# Altium footprint library PcbLib.PcbLib: 108 footprints (part 5 of 7)
Each footprint in its own frame and in the unit in brackets; x right, y up, seen from the top. Pads: shape width x height; smd on the part's side, far side on the other; paste and mask are expansions set on the pad; w line width, h text height; cw(c..) or ccw(c..) is an arc to the next point about the centre after c.
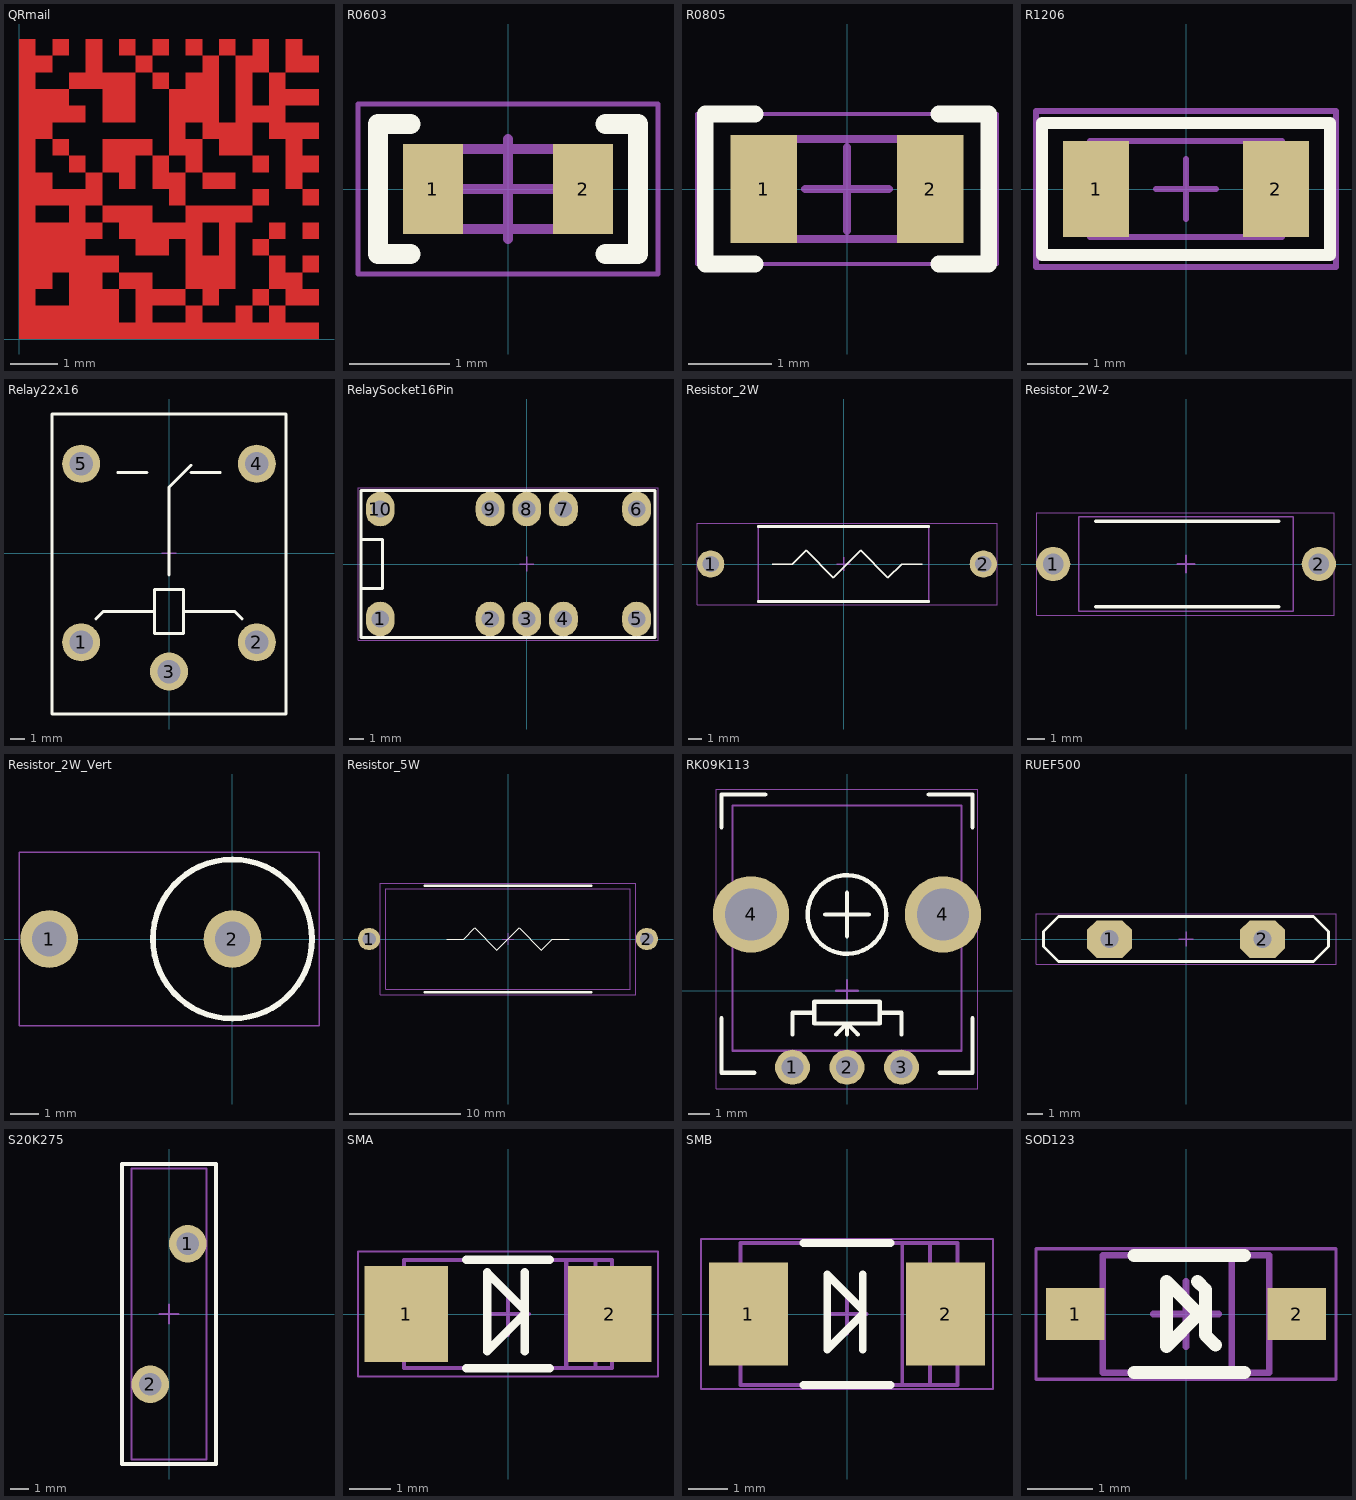
[diagram p4: the footprints below, top view; thin cyan lines are the x and y axes]

## QRmail [mm]
Top Layer:
  rectangle: 1.4,0.35 1.75,0.7
  rectangle: 1.4,0.7 1.75,1.05
  rectangle: 1.05,0.7 1.4,1.05
  rectangle: 1.05,0.35 1.4,0.7
  rectangle: 0.7,0.35 1.05,0.7
  rectangle: 0.35,0.35 0.7,0.7
  rectangle: 0.35,1.4 0.7,1.75
  rectangle: 1.05,1.05 1.4,1.4
  rectangle: 1.4,1.05 1.75,1.4
  rectangle: 1.75,0.35 2.1,0.7
  rectangle: 1.75,0.7 2.1,1.05
  rectangle: 2.1,1.05 2.45,1.4
  rectangle: 2.45,1.05 2.8,1.4
  rectangle: 2.45,0.7 2.8,1.05
  rectangle: 2.8,0.7 3.15,1.05
  rectangle: 3.15,0.7 3.5,1.05
  rectangle: 2.45,0.35 2.8,0.7
  rectangle: 3.5,0.35 3.85,0.7
  rectangle: 4.55,0.35 4.9,0.7
  rectangle: 5.25,0.35 5.6,0.7
  rectangle: 4.9,0.7 5.25,1.05
  rectangle: 5.6,0.7 5.95,1.05
  rectangle: 3.85,0.7 4.2,1.05
  rectangle: 3.5,1.05 3.85,1.4
  rectangle: 3.85,1.05 4.2,1.4
  rectangle: 4.2,1.05 4.55,1.4
  rectangle: 5.25,1.05 5.6,1.4
  rectangle: 5.6,1.05 5.95,1.4
  rectangle: 0.35,1.05 0.7,1.4
  rectangle: 0.7,1.4 1.05,1.75
  rectangle: 1.05,1.4 1.4,1.75
  rectangle: 1.4,1.4 1.75,1.75
  rectangle: 1.75,1.4 2.1,1.75
  rectangle: 3.5,1.4 3.85,1.75
  rectangle: 3.85,1.4 4.2,1.75
  rectangle: 4.2,1.4 4.55,1.75
  rectangle: 5.25,1.4 5.6,1.75
  rectangle: 4.9,1.75 5.25,2.1
  rectangle: 4.2,1.75 4.55,2.1
  rectangle: 3.5,1.75 3.85,2.1
  rectangle: 2.8,1.75 3.15,2.1
  rectangle: 2.45,1.75 2.8,2.1
  rectangle: 0.35,1.75 0.7,2.1
  rectangle: 0.7,1.75 1.05,2.1
  rectangle: 1.05,1.75 1.4,2.1
  rectangle: 1.4,2.1 1.75,2.45
  rectangle: 1.05,2.1 1.4,2.45
  rectangle: 0.35,2.1 0.7,2.45
  rectangle: 0.7,2.1 1.05,2.45
  rectangle: 2.1,2.1 2.45,2.45
  rectangle: 2.45,2.1 2.8,2.45
  rectangle: 2.8,2.1 3.15,2.45
  rectangle: 3.15,2.1 3.5,2.45
  rectangle: 3.5,2.1 3.85,2.45
  rectangle: 4.2,2.1 4.55,2.45
  rectangle: 5.25,2.1 5.6,2.45
  rectangle: 4.55,2.45 4.9,2.8
  rectangle: 4.2,2.45 4.55,2.8
  rectangle: 3.85,2.45 4.2,2.8
  rectangle: 3.5,2.45 3.85,2.8
  rectangle: 2.45,2.45 2.8,2.8
  rectangle: 2.1,2.45 2.45,2.8
  rectangle: 1.75,2.45 2.1,2.8
  rectangle: 1.05,2.45 1.4,2.8
  rectangle: 0.35,3.15 0.7,3.5
  rectangle: 0.35,2.8 0.7,3.15
  rectangle: 0.7,2.8 1.05,3.15
  rectangle: 1.05,2.8 1.4,3.15
  rectangle: 1.4,2.8 1.75,3.15
  rectangle: 1.4,3.15 1.75,3.5
  rectangle: 5.6,3.15 5.95,3.5
  rectangle: 5.6,3.5 5.95,3.85
  rectangle: 5.6,3.85 5.95,4.2
  rectangle: 4.9,2.8 5.25,3.15
  rectangle: 4.9,3.5 5.25,3.85
  rectangle: 4.55,3.85 4.9,4.2
  rectangle: 4.2,3.85 4.55,4.2
  rectangle: 4.2,3.15 4.55,3.5
  rectangle: 3.85,3.15 4.2,3.5
  rectangle: 3.5,3.5 3.85,3.85
  rectangle: 3.5,3.85 3.85,4.2
  rectangle: 3.15,3.85 3.5,4.2
  rectangle: 3.15,2.8 3.5,3.15
  rectangle: 3.15,3.15 3.5,3.5
  rectangle: 2.8,3.15 3.15,3.5
  rectangle: 2.8,3.5 3.15,3.85
  rectangle: 2.45,3.85 2.8,4.2
  rectangle: 2.1,3.15 2.45,3.5
  rectangle: 2.1,3.5 2.45,3.85
  rectangle: 2.1,3.85 2.45,4.2
  rectangle: 1.75,3.5 2.1,3.85
  rectangle: 1.75,3.85 2.1,4.2
  rectangle: 1.05,3.5 1.4,3.85
  rectangle: 0.7,3.85 1.05,4.2
  rectangle: 0.35,4.2 0.7,4.55
  rectangle: 3.15,4.55 3.5,4.9
  rectangle: 3.85,4.2 4.2,4.55
  rectangle: 4.2,4.2 4.55,4.55
  rectangle: 4.55,4.2 4.9,4.55
  rectangle: 5.25,4.2 5.6,4.55
  rectangle: 5.6,4.2 5.95,4.55
  rectangle: 5.25,4.55 5.6,4.9
  rectangle: 4.9,4.55 5.25,4.9
  rectangle: 4.55,4.55 4.9,4.9
  rectangle: 3.85,4.55 4.2,4.9
  rectangle: 3.5,4.55 3.85,4.9
  rectangle: 3.15,4.2 3.5,4.55
  rectangle: 2.1,4.55 2.45,4.9
  rectangle: 1.75,4.55 2.1,4.9
  rectangle: 0.35,4.55 0.7,4.9
  rectangle: 0.7,4.55 1.05,4.9
  rectangle: 1.05,4.55 1.4,4.9
  rectangle: 0.35,4.9 0.7,5.25
  rectangle: 0.7,4.9 1.05,5.25
  rectangle: 1.75,4.9 2.1,5.25
  rectangle: 2.1,4.9 2.45,5.25
  rectangle: 3.15,4.9 3.5,5.25
  rectangle: 3.5,4.9 3.85,5.25
  rectangle: 3.85,4.9 4.2,5.25
  rectangle: 4.55,4.9 4.9,5.25
  rectangle: 5.25,4.9 5.6,5.25
  rectangle: 5.6,4.9 5.95,5.25
  rectangle: 5.25,5.25 5.6,5.6
  rectangle: 4.55,5.25 4.9,5.6
  rectangle: 3.85,5.25 4.2,5.6
  rectangle: 3.5,5.25 3.85,5.6
  rectangle: 2.8,5.25 3.15,5.6
  rectangle: 2.1,5.25 2.45,5.6
  rectangle: 1.75,5.25 2.1,5.6
  rectangle: 1.4,5.25 1.75,5.6
  rectangle: 1.05,5.25 1.4,5.6
  rectangle: 5.6,5.6 5.95,5.95
  rectangle: 4.9,5.6 5.25,5.95
  rectangle: 4.55,5.6 4.9,5.95
  rectangle: 3.85,5.6 4.2,5.95
  rectangle: 2.45,5.6 2.8,5.95
  rectangle: 1.4,5.6 1.75,5.95
  rectangle: 0.35,5.6 0.7,5.95
  rectangle: 5.95,0.7 6.3,1.05
  rectangle: 5.95,1.4 6.3,1.75
  rectangle: 5.95,2.1 6.3,2.45
  rectangle: 5.95,2.8 6.3,3.15
  rectangle: 5.95,3.5 6.3,3.85
  rectangle: 5.95,4.2 6.3,4.55
  rectangle: 5.95,4.9 6.3,5.25
  rectangle: 5.95,5.6 6.3,5.95
  rectangle: 5.6,5.95 5.95,6.3
  rectangle: 4.9,5.95 5.25,6.3
  rectangle: 4.2,5.95 4.55,6.3
  rectangle: 3.5,5.95 3.85,6.3
  rectangle: 2.8,5.95 3.15,6.3
  rectangle: 2.1,5.95 2.45,6.3
  rectangle: 1.4,5.95 1.75,6.3
  rectangle: 0.7,5.95 1.05,6.3
  rectangle: 0,0.35 0.35,6.3
  rectangle: 0,0 6.3,0.35

## R0603 [mm]
height 0.45
pads (2):
  rect 0.6x0.9 smd: 1(-0.75,0) 2(0.75,0)
Top Overlay:
  lines w0.2: -0.975,-0.65 -1.3,-0.65 -1.3,0.65 -0.975,0.65 ; 0.975,-0.65 1.3,-0.65 1.3,0.65 0.975,0.65
Mechanical 13:
  lines w0.05: -1.5,-0.85 -1.5,0.85 1.5,0.85 1.5,-0.85 -1.5,-0.85
  lines w0.1: -0.5,0 0.5,0 ; 0,-0.5 0,0.5
Mechanical 14:
  lines w0.1: -0.8,-0.4 -0.8,0.4 0.7,0.4 0.7,-0.4 -0.8,-0.4
3D body "User Library-CR1608-0603.step": height 0.45, standoff 0, extent -0.8,-0.4 0.8,0.4

## R0805 [mm]
height 0.6
pads (2):
  rect 0.8x1.3 smd: 1(-1,0) 2(1,0)
Top Overlay:
  lines w0.2: -1.1,-0.9 -1.7,-0.9 -1.7,0.9 -1.1,0.9 ; 1.1,-0.9 1.7,-0.9 1.7,0.9 1.1,0.9
Mechanical 13:
  lines w0.05: -1.8,-0.9 -1.8,0.9 1.8,0.9 1.8,-0.9 -1.8,-0.9
  lines w0.1: -0.5,0 0.5,0 ; 0,-0.5 0,0.5
Mechanical 14:
  lines w0.1: -1,-0.6 -1,0.6 1,0.6 1,-0.6 -1,-0.6
3D body "User Library-CR2012-0805.step": height 0.6, standoff 0, extent -1,-0.625 1,0.625

## R1206 [mm]
height 0.6
pads (2):
  rect 1.1x1.6 smd: 1(-1.5,0) 2(1.5,0)
Top Overlay:
  lines w0.2: -2.4,-1.1 -2.4,1.1 2.4,1.1 2.4,-1.1 -2.4,-1.1
Mechanical 13:
  lines w0.1: -0.5,0 0.5,0 ; 0,-0.5 0,0.5 ; -2.5,-1.3 2.5,-1.3 2.5,1.3 -2.5,1.3 -2.5,-1.3
Mechanical 14:
  lines w0.1: -1.6,-0.8 -1.6,0.8 1.6,0.8 1.6,-0.8 -1.6,-0.8
3D body "User Library-CR3216-1206.step": height 0.6, standoff 0, extent -1.6,-0.8 1.6,0.8

## Relay22x16 [mm]
height 15
pads (5):
  round 2.6 hole 1.6: 1(-6,-6.1) 2(6,-6.1) 3(0,-8.1) 4(6,6.1) 5(-6,6.1)
Top Overlay:
  lines w0.2: -5,-4.5 -4.5,-4 -1,-4 ; -3.5,5.5 -1.5,5.5 ; 0,-1.5 0,4.5 1.5,6 ; 1.5,5.5 3.5,5.5 ; 5,-4.5 4.5,-4 1,-4 ; 1,-4 1,-5.5 -1,-5.5 -1,-2.5 1,-2.5 1,-4 ; -8,-11 -8,9.5 0,9.5 8,9.5 8,-11 -8,-11
Mechanical 13:
  lines w0.05: -8,-11 -8,9.5 8,9.5 8,-11 -8,-11
  lines w0.1: -0.5,0 0.5,0 ; 0,-0.5 0,0.5
Mechanical 14:
  lines w0.1: -8,-11 -8,9.5 8,9.5 8,-11 -8,-11
3D body "RELAY  12MMx12MM SQUARE-1.step": height 15.1, standoff -1.9, extent -8,-11 8,9

## RelaySocket16Pin [mm]
pads (10):
  oval 2x2.4 hole 1.2 unplated: 1(-10.16,-3.81) 2(-2.54,-3.81) 3(0,-3.81) 4(2.54,-3.81) 5(7.62,-3.81) 6(7.62,3.81) 7(2.54,3.81) 8(0,3.81) 9(-2.54,3.81) 10(-10.16,3.81)
Top Overlay:
  lines w0.2: -11.5,1.7 -10,1.7 -10,-1.7 -11.4,-1.7 ; -11.5,-5.1 8.9,-5.1 8.9,5.1 -11.5,5.1 -11.5,-5.1
Mechanical 13:
  lines w0.05: -11.7,-5.3 -11.7,5.3 9.1,5.3 9.1,-5.3 -11.7,-5.3
  lines w0.1: -0.5,0 0.5,0 ; 0,-0.5 0,0.5
Mechanical 14:
  lines w0.1: -11.5,-1.7 -10,-1.7 -10,1.7 -11.5,1.7 ; -11.5,-5.1 -11.5,5.1 8.9,5.1 8.9,-5.1 -11.5,-5.1
3D body "16DIP_Socket.step": height 4.19, standoff -3.18, extent -11.46,-5.06 8.86,5.1

## Resistor_2W [mm] "5x12mm"
height 10
pads (2):
  round 2 hole 1.2: 1(-9.75,0) 2(10.25,0)
Top Overlay:
  lines w0.1: -5.25,0 -3.75,0 -2.75,1 -0.75,-1 ; 5.75,0 4.25,0 3.25,-1 1.25,1 -0.75,-1 ; -0.75,-1 -0.75,-1
  lines w0.2: -6.25,-2.75 6.25,-2.75 ; -6.25,2.75 6.25,2.75
Mechanical 13:
  lines w0.05: -10.75,-3 11.25,-3 11.25,3 -10.75,3 -10.75,-3
  lines w0.1: -0.5,0 0.5,0 ; 0,-0.5 0,0.5
Mechanical 14:
  lines w0.1: -6.25,-2.75 -6.25,2.75 6.25,2.75 6.25,-2.75 -6.25,-2.75
3D body "RES-2W.STEP": height 7, standoff -1.5, extent -10.26,-2.75 10.76,2.75

## Resistor_2W-2 [mm] "15mm"
height 10
pads (2):
  round 2 hole 1.2: 1(-7.75,0) 2(7.75,0)
Top Overlay:
  lines w0.2: -5.275,-2.5 5.425,-2.5 ; -5.275,2.5 5.4,2.5
Mechanical 13:
  lines w0.05: -8.7,-3 8.65,-3 8.65,3 -8.7,3 -8.7,-3
  lines w0.1: -0.5,0 0.5,0 ; 0,-0.5 0,0.5
Mechanical 14:
  lines w0.1: -6.25,-2.75 -6.25,2.75 6.25,2.75 6.25,-2.75 -6.25,-2.75
3D body "User Library-RES-1W.STEP": height 6.5, standoff -1.5, extent -7.87,-2.525 8.07,2.475

## Resistor_2W_Vert [mm] "5x12mm"
height 10
pads (2):
  round 2 hole 1.2: 1(-6.35,0) 2(0,0)
Top Overlay:
  circle w0.2: c0,0 r2.759
Mechanical 13:
  lines w0.05: -7.4,-3 3,-3 3,3 -7.4,3 -7.4,-3
  lines w0.1: -0.5,0 0.5,0 ; 0,-0.5 0,0.5
Mechanical 14:
  circle w0.1: c0,0 r2.78
3D body "RES 2W -V  L=15 D=5 d=0,8 Pin2Pin=6,35.STEP": height 20.35, standoff -2, extent -6.747,-2.501 2.5,2.501

## Resistor_5W [mm] "22x10x10"
height 10
pads (2):
  round 2 hole 1.2: 1(-12.5,0) 2(12.5,0)
Top Overlay:
  lines w0.1: -5.5,0 -4,0 -3,1 -1,-1 ; 5.5,0 4,0 3,-1 1,1 -1,-1 ; -1,-1 -1,-1
  lines w0.2: -7.5,-4.8 7.5,-4.8 ; -7.5,4.8 7.5,4.8
Mechanical 13:
  lines w0.05: -11.5,-5 -11.5,5 11.5,5 11.5,-4.5 11.5,-5 -11.5,-5
  lines w0.1: -0.5,0 0.5,0 ; 0,-0.5 0,0.5
Mechanical 14:
  lines w0.1: -11,-4.5 11,-4.5 11,4.5 -11,4.5 -11,0 -11,-4.5
3D body "5W1.STEP": height 10.01, standoff -1.11, extent -13,-4.75 12.807,4.75

## RK09K113 [mm] "RK09K113 20x7mm"
height 20
pads (5):
  round 1.6 hole 1: 1(-2.5,-3.5) 2(0,-3.5) 3(2.5,-3.5)
  round 3.5 hole 2.4: 4(-4.4,3.5) 4(4.4,3.5)
Top Overlay:
  circle w0.2: c0,3.5 r1.803
  lines w0.2: -5.75,-1.25 -5.75,-3.75 -4.25,-3.75 ; -5.75,7.5 -5.75,9 -3.75,9 ; -2.5,-2 -2.5,-1 -1.5,-1 ; -1,3.5 1,3.5 ; -0.5,-2 0,-1.5 ; 0,-2 0,-1.5 ; 0,2.5 0,4.5 ; 0.5,-2 0,-1.5 ; 1.5,-1 2.5,-1 ; 2.5,-2 2.5,-1 ; 3.75,9 5.75,9 5.75,7.5 ; 4.25,-3.75 5.75,-3.75 5.75,-1.25 ; -1.5,-1 -1.5,-0.5 1.5,-0.5 1.5,-1.5 -1.5,-1.5 -1.5,-1 ; 0,-1.5 0,-1.5 ; 0,-1.5 0,-1.5 ; 2.5,-1 2.5,-1
Mechanical 13:
  lines w0.05: -6,-4.5 6,-4.5 6,9.25 -6,9.25 -6,-4.5
  lines w0.1: -0.5,0 0.5,0 ; 0,-0.5 0,0.5
Mechanical 14:
  lines w0.1: -5.25,-2.75 5.25,-2.75 5.25,8.5 -5.25,8.5 -5.25,-2.75
3D body "RK09K1130-20-1.step": height 20, standoff -3.7, extent -5.698,-3.65 5.698,9

## RUEF500 [mm]
height 30
pads (2):
  oct 3x2.5 hole 1.2: 1(-5.1,0) 2(5.1,0)
Top Overlay:
  lines w0.2: -9.5,-0.5 -9.5,0.5 -8.5,1.5 0,1.5 8.5,1.5 9.5,0.5 9.5,-0.5 8.5,-1.5 -8.5,-1.5 -9.5,-0.5
Mechanical 13:
  lines w0.05: -10,-1.7 -10,1.7 10,1.7 10,-1.7 -10,-1.7
  lines w0.1: -0.5,0 0.5,0 ; 0,-0.5 0,0.5
Mechanical 14:
  lines w0.1: -9.5,0.4 -9.5,0.5 -8.5,1.5 8.5,1.5 ; -9.5,0.45 -9.5,-0.5 ; -9.5,-0.5 -8.5,-1.5 8.5,-1.5 9.5,-0.5 ; -9.5,-0.5 -9.5,-0.5 ; 8.5,1.5 8.5,1.5 ; 8.5,1.5 9.5,0.5 9.5,-0.5 ; 9.5,-0.5 9.5,-0.5
3D body "User Library-MF-R700-1.step": height 29.8, standoff -4, extent -10.801,-3.254 10.801,3.3

## S20K275 [mm] "Varistor EPCOS"
height 17
pads (2):
  round 2 hole 1.2: 1(1,3.75) 2(-1,-3.75)
Top Overlay:
  lines w0.2: -2.5,-8 2.5,-8 2.5,8 -2.5,8 -2.5,-8
Mechanical 13:
  lines w0.05: -2.5,-8 -2.5,8 2.5,8 2.5,-8 -2.5,-8
  lines w0.1: -0.5,0 0.5,0 ; 0,-0.5 0,0.5
Mechanical 14:
  lines w0.1: -2,-7.75 2,-7.75 2,7.75 -2,7.75 -2,-7.75
3D body "User Library-S14K25 MOV.step": height 19.5, standoff -2, extent -2.1,-7.75 2.1,7.75

## SMA [mm] "4007 diode(in SMD pack)"
height 2.2
pads (2):
  rect 2x2.3 smd: 1(-2.44,0) 2(2.44,0)
Top Overlay:
  lines w0.2: -1,-1.3 1,-1.3 ; -1,1.3 1,1.3 ; 0.4,-0.9 0.4,1 0.4,0.1 ; 0.4,0.1 0.4,0 -0.5,-0.9 -0.5,1 0.4,0.1
Mechanical 13:
  lines w0.05: -3.6,-1.5 3.6,-1.5 3.6,1.5 -3.6,1.5 -3.6,-1.5
  lines w0.1: -0.5,0 0.5,0 ; 0,-0.5 0,0.5
Mechanical 14:
  lines w0.1: 1.4,-1.3 1.4,1.3 ; 2.1,-1.3 2.1,1.3 ; -2.5,-1.3 2.5,-1.3 2.5,1.3 -2.5,1.3 -2.5,-1.3
3D body "User Library-S1G-1.step": height 2.7, standoff 0, extent -2.8,-1.475 2.8,1.475

## SMB [mm] "SMB pack"
height 2.4
pads (2):
  rect 2x2.6 smd: 1(-2.5,0) 2(2.5,0)
Top Overlay:
  lines w0.2: -1.1,-1.8 1.1,-1.8 ; -1.1,1.8 1.1,1.8 ; 0.4,-0.9 0.4,1 0.4,0.1 ; 0.4,0.1 0.4,0 -0.5,-0.9 -0.5,1 0.4,0.1
Mechanical 13:
  lines w0.05: -3.7,-1.9 3.7,-1.9 3.7,1.9 -3.7,1.9 -3.7,-1.9
  lines w0.1: -0.5,0 0.5,0 ; 0,-0.5 0,0.5
Mechanical 14:
  lines w0.1: 1.4,-1.8 1.4,1.8 ; 2.1,-1.8 2.1,1.8 ; -2.7,-1.8 2.8,-1.8 2.8,1.8 -2.7,1.8 -2.7,-1.8
3D body "DO-214AA_SMB.step": height 2.25, standoff 0, extent -2.65,-1.85 2.65,1.85

## SOD123 [mm] "diode(in SMD pack)"
height 2.2
pads (2):
  rect 0.9x0.8 smd: 1(-1.7,0) 2(1.7,0)
Top Overlay:
  lines w0.2: -0.8,-0.9 0.9,-0.9 ; -0.8,0.9 0.9,0.9 ; 0.175,0.5 0.3,0.375 0.3,-0.325 0.45,-0.475 ; -0.3,-0.5 -0.3,0.5 0.2,0 -0.3,-0.5
Mechanical 13:
  lines w0.05: -2.3,-1 -2.3,1 2.3,1 2.3,-1 -2.3,-1
  lines w0.1: -0.5,0 0.5,0 ; 0,-0.5 0,0.5
Mechanical 14:
  lines w0.1: 0.7,-0.8 0.7,0.8 ; -1.275,-0.9 1.275,-0.9 1.275,0.9 -1.275,0.9 -1.275,-0.9
3D body "User Library-SOD-123 CASE 425-04.STEP": height 1.2, standoff 0, extent -1.65,-0.8 1.65,0.8